# Altium footprint library Tomra_Cadstar_Footprints.PcbLib: 380 footprints (part 3 of 24)
Each footprint in its own frame and in the unit in brackets; x right, y up, seen from the top. Pads: shape width x height; smd on the part's side, far side on the other; paste and mask are expansions set on the pad; w line width, h text height; cw(c..) or ccw(c..) is an arc to the next point about the centre after c.
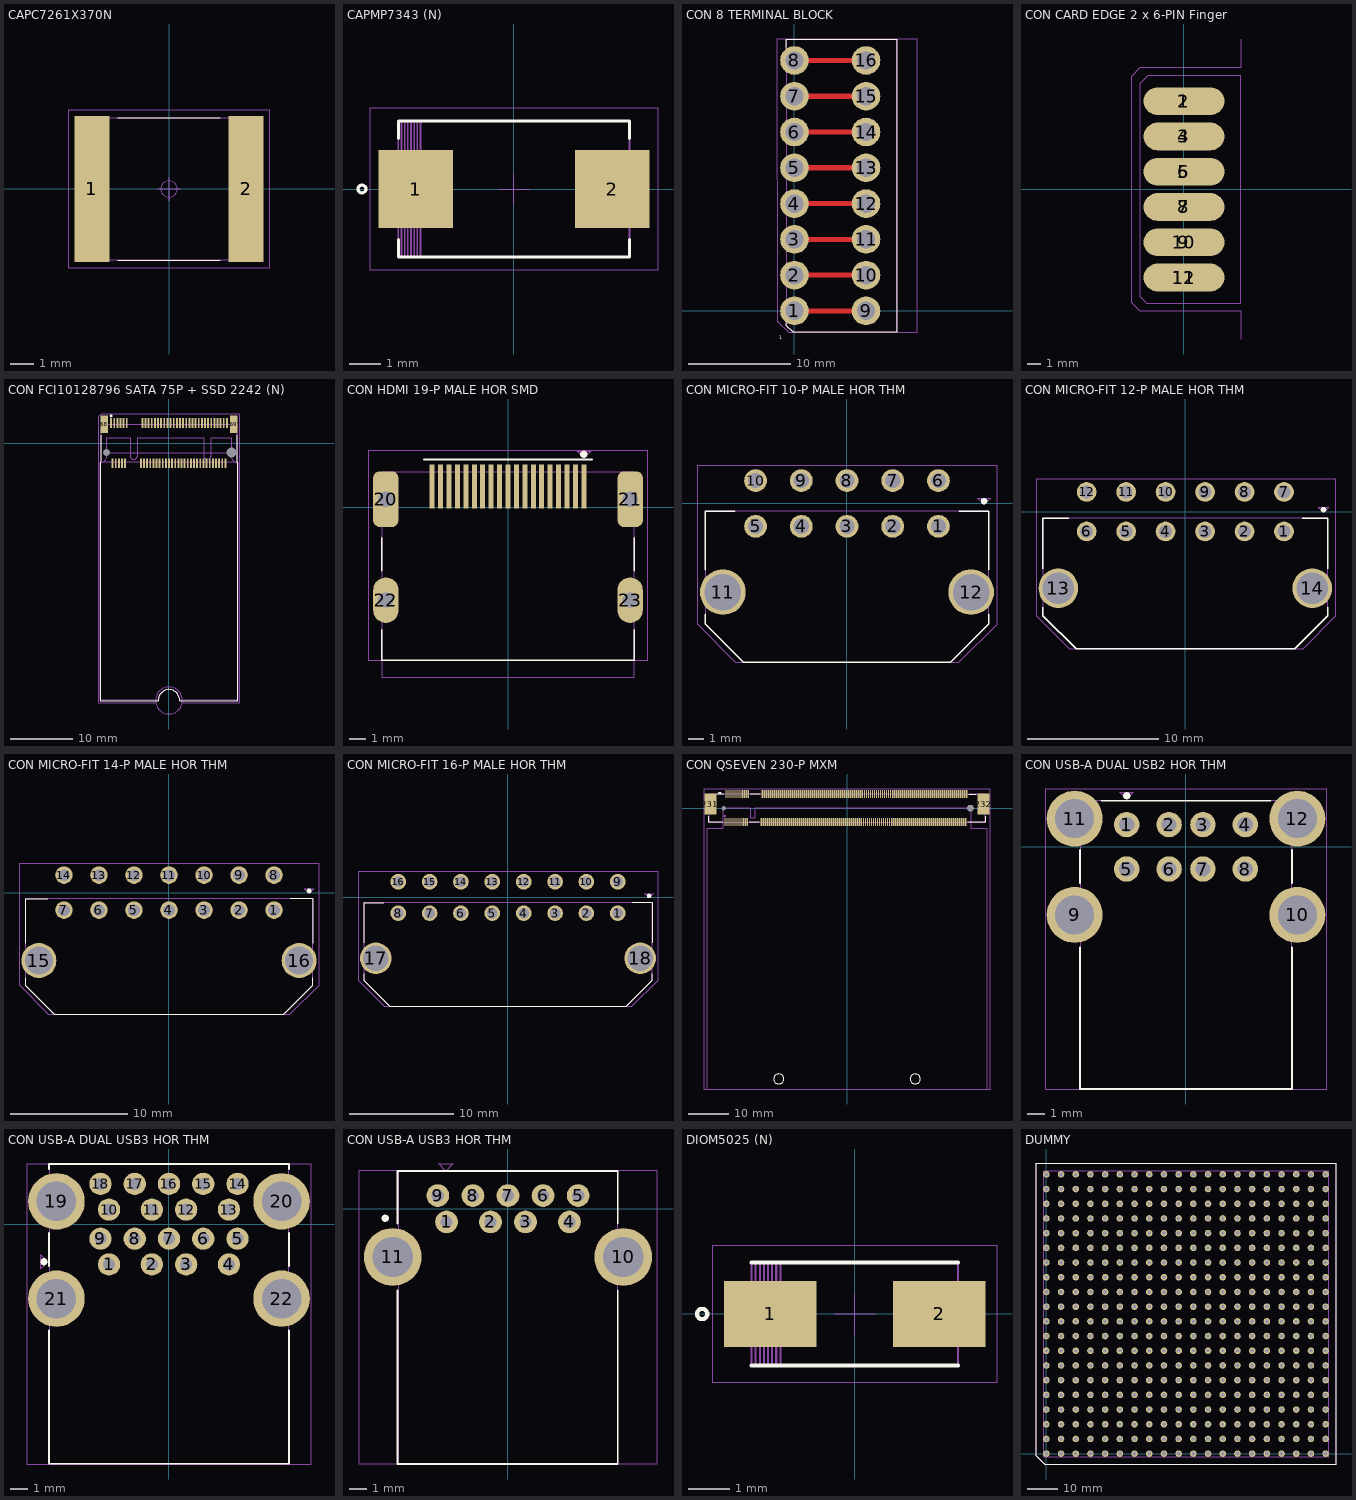
[diagram p2: the footprints below, top view; thin cyan lines are the x and y axes]

## CAPC7261X370N [mm]
pads (2):
  rect 1.5x6.25 smd paste+0 mask+0: 1(-3.3,0) 2(3.3,0)
Top Silk:
  lines w0.05: -2.2,-3.05 2.2,-3.05 ; -2.2,3.05 2.2,3.05
  text ".Designator" at 0,0 h0.7
Top Assembly:
  lines w0.05: -3.6,-3.05 -3.6,3.05 3.6,3.05 3.6,-3.05 -3.6,-3.05
Top Placement:
  lines w0.05: -0.5,0 0.5,0 ; 0,-0.5 0,0.5 ; -4.3,-3.4 -4.3,3.4 4.3,3.4 4.3,-3.4 -4.3,-3.4 ; -0.35,0 cw(c0,0) 0.35,0 cw(c0,0) -0.35,0

## CAPMP7343 (N) [mm]
height 4.3
pads (2):
  rect 2.35x2.45 smd paste+0 mask+0: 1(-3.1,0) 2(3.1,0)
Top Silk:
  lines w0.1: -3.65,-1.6 -3.65,-2.15 3.65,-2.15 3.65,-1.6 ; -3.65,1.6 -3.65,2.15 3.65,2.15 3.65,1.6 ; -4.925,0 cw(c-4.8,0) -4.675,0 cw(c-4.8,0) -4.925,0
  text ".Designator" at -3.65,2.15 h0.7
Top Assembly:
  lines w0.05: -3.55,-2.15 -3.55,2.15 ; -3.45,-2.15 -3.45,2.15 ; -3.35,-2.15 -3.35,2.15 ; -3.25,-2.15 -3.25,2.15 ; -3.15,-2.15 -3.15,2.15 ; -3.05,-2.15 -3.05,2.15 ; -2.95,-2.15 -2.95,2.15 ; -3.65,-2.15 3.65,-2.15 3.65,2.15 -3.65,2.15 ; -3.65,-2.15 -3.65,2.15 ; -3.65,-2.15 -3.65,2.15
Top Placement:
  lines w0.01: -0.5,0 0.5,0 ; 0,-0.5 0,0.5 ; -4.55,-2.55 4.55,-2.55 4.55,2.55 -4.55,2.55 -4.55,-2.55

## CON 8 TERMINAL BLOCK [mm]
pads (16):
  round 2.8 / inner round 1.524 / far side round 2.8 hole 1.8 paste+0 mask+0: 1(0,0) 2(0,3.5) 3(0,7) 4(0,10.5) 5(0,14) 6(0,17.5) 7(0,21) 8(0,24.5) 9(7,0) 10(7,3.5) 11(7,7) 12(7,10.5) 13(7,14) 14(7,17.5) 15(7,21) 16(7,24.5)
Top Elec:
  lines w0.5: 0.1,0 7,0 ; 0.1,3.5 7,3.5 ; 0.1,7 7,7 ; 0.1,10.5 7,10.5 ; 0.1,14 7,14 ; 0.1,17.5 7,17.5 ; 0.1,21 7,21 ; 0.1,24.5 7,24.5
Top Silk:
  lines w0.1: -0.8,-1.191 -0.8,-1.43 -0.1,-2.1 10,-2.1 10,26.6 -0.8,26.6 -0.8,25.691
  text "1" at -1.5,-2.75 h0.35
  text ".Designator" at 0,0 h0.7
Top Assembly:
  lines w0.05: -0.8,-1.398 -0.05,-2.1 10,-2.1 10,26.6 -0.8,26.6 -0.8,-1.398
Top Placement:
  lines w0.01: -1.725,26.6 12,26.6 12,-2.1 -0.575,-2.1 -1.7,-1 -1.725,26.6

## CON CARD EDGE 2 x 6-PIN Finger [mm]
pads (12):
  oval 5.82x2 / inner round 1.524 / far side oval 5.82x2 all layers, no hole paste+0 mask+0: 1(0,6.35) 2(0,6.35) 3(0,3.81) 4(0,3.81) 5(0,1.27) 6(0,1.27) 7(0,-1.27) 8(0,-1.27) 9(0,-3.81) 10(0,-3.81) 11(0,-6.35) 12(0,-6.35)
Top Silk:
  text ".Designator" at 0,0 h0.7
Top Assembly:
  lines w0.05: 4.09,-10.78 4.09,-8.763 -3.175,-8.763 -3.81,-8.128 -3.81,8.128 -3.175,8.763 4.09,8.763 4.09,10.83
Top Placement:
  lines w0.01: -3.2,-7.7 -3.2,7.6 -2.6,8.2 4.1,8.2 4.1,-8.2 -2.7,-8.2 -3.2,-7.7

## CON FCI10128796 SATA 75P + SSD 2242 (N) [mm]
height 8.7
pads (71):
  rect 0.3x1.55 smd paste+0 mask+0: 1(-9.25,3.269) 2(-9,-3.181) 3(-8.75,3.269) 4(-8.5,-3.181) 5(-8.25,3.269) 6(-8,-3.181) 7(-7.75,3.269) 8(-7.5,-3.181) 9(-7.25,3.269) 10(-7,-3.181) 11(-6.75,3.269) 12(-4.5,-3.181) 13(-4.25,3.269) 14(-4,-3.181) 15(-3.75,3.269) 16(-3.5,-3.181) 17(-3.25,3.269) 18(-3,-3.181) 19(-2.75,3.269) 20(-2.5,-3.181) 21(-2.25,3.269) 22(-2,-3.181) 23(-1.75,3.269) 24(-1.5,-3.181) 25(-1.25,3.269) 26(-1,-3.181) 27(-0.75,3.269) 28(-0.5,-3.181) 29(-0.25,3.269) 30(0,-3.181) 31(0.25,3.269) 32(0.5,-3.181) 33(0.75,3.269) 34(1,-3.181) 35(1.25,3.269) 36(1.5,-3.181) 37(1.75,3.269) 38(2,-3.181) 39(2.25,3.269) 40(2.5,-3.181) 41(2.75,3.269) 42(3,-3.181) 43(3.25,3.269) 44(3.5,-3.181) 45(3.75,3.269) 46(4,-3.181) 47(4.25,3.269) 48(4.5,-3.181) 49(4.75,3.269) 50(5,-3.181) 51(5.25,3.269) 52(5.5,-3.181) 53(5.75,3.269) 54(6,-3.181) 55(6.25,3.269) 56(6.5,-3.181) 57(6.75,3.269) 58(7,-3.181) 59(7.25,3.269) 60(7.5,-3.181) 61(7.75,3.269) 62(8,-3.181) 63(8.25,3.269) 64(8.5,-3.181) 65(8.75,3.269) 66(9,-3.181) 67(9.25,3.269)
  rect 1.2x2.75 smd paste+0 mask+0: 68(-10.35,3.049) 69(10.35,3.049)
  round 0 / inner round 1.524 / far side round 0 hole 1.6 unplated paste+0 mask+0: 70(10,-1.466)
  round 0 / inner round 1.524 / far side round 0 hole 1.1 unplated paste+0 mask+0: 71(-10,-1.466)
Top Silk:
  region: -9.25,4.194 -9.29,4.194 -9.363,4.225 -9.42,4.281 -9.45,4.354 -9.45,4.434 -9.42,4.507 -9.363,4.564 -9.29,4.594 -9.25,4.594 -9.21,4.594 -9.137,4.564 -9.08,4.507 -9.05,4.434 -9.05,4.354 -9.08,4.281 -9.137,4.225 -9.21,4.194
  lines w0.1: -10.9,1.294 -10.9,-2.806 -11,-2.906 -11,-41.106 -1.7,-41.106 cw(c0,-41.006) -0.1,-39.306 0,-39.306 cw(c-0.05,-41.056) 1.7,-41.106 11,-41.106 11,-3.106 10.9,-3.006 10.9,1.394
Top Assembly:
  lines w0.05: -9.925,-1.466 9.925,-1.466 ; -11,-41.066 -1.75,-41.066 cw(c0,-41.066) 0,-39.316 cw(c0,-41.066) 1.75,-41.066 11,-41.066 11,-3.066 cw(c11,-1.991) 9.925,-1.991 9.925,0.934 6.725,0.934 6.725,-1.966 cw(c6.125,-1.966) 6.125,-2.566 cw(c6.125,-1.966) 5.525,-1.966 5.525,0.934 -5.025,0.934 -5.025,-1.966 cw(c-5.625,-1.966) -5.625,-2.566 cw(c-5.625,-1.966) -6.225,-1.966 -6.225,0.934 -9.925,0.934 -9.925,-1.991 cw(c-11,-1.991) -11,-3.066 -11,-41.066 ; -10.925,-2.906 10.925,-2.906 10.925,2.994 -10.2,2.994 -10.925,2.269 -10.925,-2.906
  text ".Designator" at -3.699,4.919 h0.7
Top Placement:
  lines w0.01: -11.3,-41.406 -2.102,-41.406 ccw(c0.002,-41.097) 2.106,-41.406 11.3,-41.406 11.3,4.694 -10.853,4.694 -11.3,4.247 -11.3,-41.406 ; 0,-43.216 cw(c0,-41.066) 0,-38.916 cw(c0,-41.066) 0,-43.216

## CON HDMI 19-P MALE HOR SMD [mm]
height 6.3
pads (23):
  rect 0.3x2.6 smd paste+0 mask+0: 1(4.5,1.25) 2(4,1.25) 3(3.5,1.25) 4(3,1.25) 5(2.5,1.25) 6(2,1.25) 7(1.5,1.25) 8(1,1.25) 9(0.5,1.25) 10(0,1.25) 11(-0.5,1.25) 12(-1,1.25) 13(-1.5,1.25) 14(-2,1.25) 15(-2.5,1.25) 16(-3,1.25) 17(-3.5,1.25) 18(-4,1.25) 19(-4.5,1.25)
  rrect50% 1.5x3.3 / inner round 1.524 / far side rrect50% 1.5x3.3 hole 0.9 paste+0 mask+0: 20(-7.25,0.49) 21(7.25,0.49)
  oval 1.5x2.7 / inner round 1.524 / far side oval 1.5x2.7 hole 0.9 mask+0: 22(-7.25,-5.5) 23(7.25,-5.5)
Top Silk:
  region: 4.5,2.95 4.46,2.95 4.387,2.98 4.33,3.037 4.3,3.11 4.3,3.19 4.33,3.263 4.387,3.32 4.46,3.35 4.5,3.35 4.54,3.35 4.613,3.32 4.67,3.263 4.7,3.19 4.7,3.11 4.67,3.037 4.613,2.98 4.54,2.95
  lines w0.1: -7.5,-7.26 -7.5,-9.06 7.5,-9.06 7.5,-7.26 ; -7.5,-3.75 -7.5,-1.8 ; -5,2.85 5,2.85 ; 7.5,-3.75 7.5,-1.8
  text ".Designator" at -0.26,3.86 h0.7
Top Assembly:
  lines w0.05: -7.5,-10.06 7.5,-10.06 7.5,2.09 -7.5,2.09 -7.5,-10.06 ; 4.1,3.34 4.5,2.94 4.9,3.34 4.1,3.34
Top Placement:
  lines w0.01: -8.3,-9.06 8.3,-9.06 8.3,3.35 -8.3,3.35 -8.3,-9.06

## CON MICRO-FIT 10-P MALE HOR THM [mm]
height 8.77
pads (12):
  round 1.5 / inner round 1.524 / far side round 1.5 hole 1 paste+0 mask+0: 1(6,-1.5) 2(3,-1.5) 3(0,-1.5) 4(-3,-1.5) 5(-6,-1.5) 6(6,1.5) 7(3,1.5) 8(0,1.5) 9(-3,1.5) 10(-6,1.5)
  round 3 / inner round 1.524 / far side round 3 hole 2.4 paste+0 mask+0: 11(-8.15,-5.82) 12(8.15,-5.82)
Top Silk:
  region: 9,-0.05 8.96,-0.05 8.887,-0.02 8.83,0.037 8.8,0.11 8.8,0.19 8.83,0.263 8.887,0.32 8.96,0.35 9,0.35 9.04,0.35 9.113,0.32 9.17,0.263 9.2,0.19 9.2,0.11 9.17,0.037 9.113,-0.02 9.04,-0.05
  lines w0.1: -9.32,-7.28 -9.32,-7.9 -6.8,-10.42 6.8,-10.42 9.32,-7.9 9.32,-7.28 ; -9.32,-4.35 -9.32,-0.51 -7.37,-0.51 ; 7.37,-0.51 9.32,-0.51 9.32,-4.35
  text ".Designator" at -7.5,3 h0.7
Top Assembly:
  lines w0.05: -9.32,-7.9 -6.8,-10.42 6.8,-10.42 9.32,-7.9 9.32,-0.51 -9.32,-0.51 -9.32,-7.9 ; 8.6,0.35 9,-0.05 9.4,0.35 8.6,0.35
Top Placement:
  lines w0.01: -9.85,-7.9 -7.33,-10.42 7.35,-10.42 9.85,-7.92 9.85,2.47 -9.85,2.47 -9.85,-7.9

## CON MICRO-FIT 12-P MALE HOR THM [mm]
height 8.77
pads (14):
  round 1.5 / inner round 1.524 / far side round 1.5 hole 1 paste+0 mask+0: 1(7.5,-1.5) 2(4.5,-1.5) 3(1.5,-1.5) 4(-1.5,-1.5) 5(-4.5,-1.5) 6(-7.5,-1.5) 7(7.5,1.5) 8(4.5,1.5) 9(1.5,1.5) 10(-1.5,1.5) 11(-4.5,1.5) 12(-7.5,1.5)
  round 3 / inner round 1.524 / far side round 3 hole 2.4 paste+0 mask+0: 13(-9.65,-5.82) 14(9.65,-5.82)
Top Silk:
  region: 10.5,-0.05 10.46,-0.05 10.387,-0.02 10.33,0.037 10.3,0.11 10.3,0.19 10.33,0.263 10.387,0.32 10.46,0.35 10.5,0.35 10.54,0.35 10.613,0.32 10.67,0.263 10.7,0.19 10.7,0.11 10.67,0.037 10.613,-0.02 10.54,-0.05
  lines w0.1: -10.82,-7.28 -10.82,-7.9 -8.3,-10.42 8.3,-10.42 10.82,-7.9 10.82,-7.28 ; -10.82,-4.35 -10.82,-0.51 -8.87,-0.51 ; 8.87,-0.51 10.82,-0.51 10.82,-4.35
  text ".Designator" at -7.5,3 h0.7
Top Assembly:
  lines w0.05: -10.82,-7.9 -8.3,-10.42 8.3,-10.42 10.82,-7.9 10.82,-0.51 -10.82,-0.51 -10.82,-7.9 ; 10.1,0.35 10.5,-0.05 10.9,0.35 10.1,0.35
Top Placement:
  lines w0.01: -11.35,-7.9 -8.83,-10.42 8.95,-10.42 11.45,-7.92 11.45,2.47 -11.35,2.47 -11.35,-7.9

## CON MICRO-FIT 14-P MALE HOR THM [mm]
height 8.77
pads (16):
  round 1.5 / inner round 1.524 / far side round 1.5 hole 1 paste+0 mask+0: 1(9,-1.5) 2(6,-1.5) 3(3,-1.5) 4(0,-1.5) 5(-3,-1.5) 6(-6,-1.5) 7(-9,-1.5) 8(9,1.5) 9(6,1.5) 10(3,1.5) 11(0,1.5) 12(-3,1.5) 13(-6,1.5) 14(-9,1.5)
  round 3 / inner round 1.524 / far side round 3 hole 2.4 paste+0 mask+0: 15(-11.15,-5.82) 16(11.15,-5.82)
Top Silk:
  region: 12,-0.05 11.96,-0.05 11.887,-0.02 11.83,0.037 11.8,0.11 11.8,0.19 11.83,0.263 11.887,0.32 11.96,0.35 12,0.35 12.04,0.35 12.113,0.32 12.17,0.263 12.2,0.19 12.2,0.11 12.17,0.037 12.113,-0.02 12.04,-0.05
  lines w0.1: -12.32,-7.28 -12.32,-7.925 -9.825,-10.42 9.825,-10.42 12.32,-7.925 12.32,-7.28 ; -12.32,-4.35 -12.32,-0.51 -10.37,-0.51 ; 10.37,-0.51 12.32,-0.51 12.32,-4.35
  text ".Designator" at -7.5,3 h0.7
Top Assembly:
  lines w0.05: -12.32,-7.925 -9.825,-10.42 9.825,-10.42 12.32,-7.925 12.32,-0.51 -12.32,-0.51 -12.32,-7.925 ; 11.6,0.35 12,-0.05 12.4,0.35 11.6,0.35
Top Placement:
  lines w0.01: -12.85,-7.9 -10.33,-10.42 10.35,-10.42 12.85,-7.92 12.85,2.47 -12.85,2.47 -12.85,-7.9

## CON MICRO-FIT 16-P MALE HOR THM [mm]
height 8.77
pads (18):
  round 1.5 / inner round 1.524 / far side round 1.5 hole 1 paste+0 mask+0: 1(10.5,-1.5) 2(7.5,-1.5) 3(4.5,-1.5) 4(1.5,-1.5) 5(-1.5,-1.5) 6(-4.5,-1.5) 7(-7.5,-1.5) 8(-10.5,-1.5) 9(10.5,1.5) 10(7.5,1.5) 11(4.5,1.5) 12(1.5,1.5) 13(-1.5,1.5) 14(-4.5,1.5) 15(-7.5,1.5) 16(-10.5,1.5)
  round 3 / inner round 1.524 / far side round 3 hole 2.4 paste+0 mask+0: 17(-12.65,-5.82) 18(12.65,-5.82)
Top Silk:
  region: 13.5,-0.05 13.46,-0.05 13.387,-0.02 13.33,0.037 13.3,0.11 13.3,0.19 13.33,0.263 13.387,0.32 13.46,0.35 13.5,0.35 13.54,0.35 13.613,0.32 13.67,0.263 13.7,0.19 13.7,0.11 13.67,0.037 13.613,-0.02 13.54,-0.05
  lines w0.1: -13.82,-7.28 -13.82,-7.9 -11.3,-10.42 11.3,-10.42 13.82,-7.9 13.82,-7.28 ; -13.82,-4.35 -13.82,-0.51 -11.87,-0.51 ; 11.87,-0.51 13.82,-0.51 13.82,-4.35
  text ".Designator" at -6,3 h0.7
Top Assembly:
  lines w0.05: -13.82,-7.9 -11.3,-10.42 11.3,-10.42 13.82,-7.9 13.82,-0.51 -13.82,-0.51 -13.82,-7.9 ; 13.1,0.35 13.5,-0.05 13.9,0.35 13.1,0.35
Top Placement:
  lines w0.01: -14.35,-7.9 -11.83,-10.42 11.85,-10.42 14.35,-7.92 14.35,2.47 -14.35,2.47 -14.35,-7.9

## CON QSEVEN 230-P MXM [mm]
height 7.8
pads (234):
  rect 0.35x2 smd paste+0 mask+0: 1(-30.4,-3.5) 2(-30.15,3.5) 3(-29.9,-3.5) 4(-29.65,3.5) 5(-29.4,-3.5) 6(-29.15,3.5) 7(-28.9,-3.5) 8(-28.65,3.5) 9(-28.4,-3.5) 10(-28.15,3.5) 11(-27.9,-3.5) 12(-27.65,3.5) 13(-27.4,-3.5) 14(-27.15,3.5) 15(-26.9,-3.5) 16(-26.65,3.5) 17(-26.4,-3.5) 18(-26.15,3.5) 19(-25.9,-3.5) 20(-25.65,3.5) 21(-25.4,-3.5) 22(-25.15,3.5) 23(-24.9,-3.5) 24(-24.65,3.5) 25(-21.4,-3.5) 26(-21.15,3.5) 27(-20.9,-3.5) 28(-20.65,3.5) 29(-20.4,-3.5) 30(-20.15,3.5) 31(-19.9,-3.5) 32(-19.65,3.5) 33(-19.4,-3.5) 34(-19.15,3.5) 35(-18.9,-3.5) 36(-18.65,3.5) 37(-18.4,-3.5) 38(-18.15,3.5) 39(-17.9,-3.5) 40(-17.65,3.5) 41(-17.4,-3.5) 42(-17.15,3.5) 43(-16.9,-3.5) 44(-16.65,3.5) 45(-16.4,-3.5) 46(-16.15,3.5) 47(-15.9,-3.5) 48(-15.65,3.5) 49(-15.4,-3.5) 50(-15.15,3.5) 51(-14.9,-3.5) 52(-14.65,3.5) 53(-14.4,-3.5) 54(-14.15,3.5) 55(-13.9,-3.5) 56(-13.65,3.5) 57(-13.4,-3.5) 58(-13.15,3.5) 59(-12.9,-3.5) 60(-12.65,3.5) 61(-12.4,-3.5) 62(-12.15,3.5) 63(-11.9,-3.5) 64(-11.65,3.5) 65(-11.4,-3.5) 66(-11.15,3.5) 67(-10.9,-3.5) 68(-10.65,3.5) 69(-10.4,-3.5) 70(-10.15,3.5) 71(-9.9,-3.5) 72(-9.65,3.5) 73(-9.4,-3.5) 74(-9.15,3.5) 75(-8.9,-3.5) 76(-8.65,3.5) 77(-8.4,-3.5) 78(-8.15,3.5) 79(-7.9,-3.5) 80(-7.65,3.5) 81(-7.4,-3.5) 82(-7.15,3.5) 83(-6.9,-3.5) 84(-6.65,3.5) 85(-6.4,-3.5) 86(-6.15,3.5) 87(-5.9,-3.5) 88(-5.65,3.5) 89(-5.4,-3.5) 90(-5.15,3.5) 91(-4.9,-3.5) 92(-4.65,3.5) 93(-4.4,-3.5) 94(-4.15,3.5) 95(-3.9,-3.5) 96(-3.65,3.5) 97(-3.4,-3.5) 98(-3.15,3.5) 99(-2.9,-3.5) 100(-2.65,3.5) 101(-2.4,-3.5) 102(-2.15,3.5) 103(-1.9,-3.5) 104(-1.65,3.5) 105(-1.4,-3.5) 106(-1.15,3.5) 107(-0.9,-3.5) 108(-0.65,3.5) 109(-0.4,-3.5) 110(-0.15,3.5) 111(0.1,-3.5) 112(0.35,3.5) 113(0.6,-3.5) 114(0.85,3.5) 115(1.1,-3.5) 116(1.35,3.5) 117(1.6,-3.5) 118(1.85,3.5) 119(2.1,-3.5) 120(2.35,3.5) 121(2.6,-3.5) 122(2.85,3.5) 123(3.1,-3.5) 124(3.35,3.5) 125(3.6,-3.5) 126(3.85,3.5) 127(4.1,-3.5) 128(4.35,3.5) 129(4.6,-3.5) 130(4.85,3.5) 131(5.1,-3.5) 132(5.35,3.5) 133(5.6,-3.5) 134(5.85,3.5) 135(6.1,-3.5) 136(6.35,3.5) 137(6.6,-3.5) 138(6.85,3.5) 139(7.1,-3.5) 140(7.35,3.5) 141(7.6,-3.5) 142(7.85,3.5) 143(8.1,-3.5) 144(8.35,3.5) 145(8.6,-3.5) 146(8.85,3.5) 147(9.1,-3.5) 148(9.35,3.5) 149(9.6,-3.5) 150(9.85,3.5) 151(10.1,-3.5) 152(10.35,3.5) 153(10.6,-3.5) 154(10.85,3.5) 155(11.1,-3.5) 156(11.35,3.5) 157(11.6,-3.5) 158(11.85,3.5) 159(12.1,-3.5) 160(12.35,3.5) 161(12.6,-3.5) 162(12.85,3.5) 163(13.1,-3.5) 164(13.35,3.5) 165(13.6,-3.5) 166(13.85,3.5) 167(14.1,-3.5) 168(14.35,3.5) 169(14.6,-3.5) 170(14.85,3.5) 171(15.1,-3.5) 172(15.35,3.5) 173(15.6,-3.5) 174(15.85,3.5) 175(16.1,-3.5) 176(16.35,3.5) 177(16.6,-3.5) 178(16.85,3.5) 179(17.1,-3.5) 180(17.35,3.5) 181(17.6,-3.5) 182(17.85,3.5) 183(18.1,-3.5) 184(18.35,3.5) 185(18.6,-3.5) 186(18.85,3.5) 187(19.1,-3.5) 188(19.35,3.5) 189(19.6,-3.5) 190(19.85,3.5) 191(20.1,-3.5) 192(20.35,3.5) 193(20.6,-3.5) 194(20.85,3.5) 195(21.1,-3.5) 196(21.35,3.5) 197(21.6,-3.5) 198(21.85,3.5) 199(22.1,-3.5) 200(22.35,3.5) 201(22.6,-3.5) 202(22.85,3.5) 203(23.1,-3.5) 204(23.35,3.5) 205(23.6,-3.5) 206(23.85,3.5) 207(24.1,-3.5) 208(24.35,3.5) 209(24.6,-3.5) 210(24.85,3.5) 211(25.1,-3.5) 212(25.35,3.5) 213(25.6,-3.5) 214(25.85,3.5) 215(26.1,-3.5) 216(26.35,3.5) 217(26.6,-3.5) 218(26.85,3.5) 219(27.1,-3.5) 220(27.35,3.5) 221(27.6,-3.5) 222(27.85,3.5) 223(28.1,-3.5) 224(28.35,3.5) 225(28.6,-3.5) 226(28.85,3.5) 227(29.1,-3.5) 228(29.35,3.5) 229(29.6,-3.5) 230(29.85,3.5)
  rect 3x5.2 smd paste+0 mask+0: 231(-34.06,1) 232(34.06,1)
  round 0 / inner round 1.524 / far side round 0 hole 1.1 unplated paste+0 mask+0: 233(-30.75,0)
  round 1.6 / inner round 1.524 / far side round 1.6 hole 1.6 unplated paste+0 mask+0: 234(30.75,0)
Top Silk:
  lines w0.1: -34.4,-2 -34.4,-3.5 -30.9,-3.5 ; -32.3,3.5 -30.65,3.5 ; -24.4,-3.5 -21.9,-3.5 ; -24.15,3.5 -21.65,3.5 ; 30.1,-3.5 34.5,-3.5 34.5,-2 ; 30.35,3.5 32.2,3.5 ; -31.9,4 -31.65,3.5 -31.4,4 -31.9,4 ; -17,-68.75 cw(c-17,-67.5) -17,-66.25 cw(c-17,-67.5) -17,-68.75 ; 17,-68.75 cw(c17,-67.5) 17,-66.25 cw(c17,-67.5) 17,-68.75
  text ".Designator" at -4.999,5.9 h0.7
Top Assembly:
  region: -30.4,-2.25 -30.45,-2.25 -30.542,-2.212 -30.612,-2.142 -30.65,-2.05 -30.65,-1.95 -30.612,-1.858 -30.542,-1.788 -30.45,-1.75 -30.4,-1.75 -30.35,-1.75 -30.258,-1.788 -30.188,-1.858 -30.15,-1.95 -30.15,-2.05 -30.188,-2.142 -30.258,-2.212 -30.35,-2.25
  lines w0.05: -35,-70 35,-70 35,-5.1 31,-5.1 31,0 -22.975,0 -22.975,-2.5 -23.975,-2.5 -23.975,0 -31,0 -31,-5.1 -35,-5.1 -35,-70 ; -34.4,-3.5 34.5,-3.5 34.5,3.5 -34.4,3.5 -34.4,-3.5
Top Placement:
  lines w0.01: -35.65,-70 35.7,-70 35.7,4.75 -35.65,4.75 -35.65,-70

## CON USB-A DUAL USB2 HOR THM [mm]
height 16
pads (12):
  round 1.5 / inner round 1.524 / far side round 1.5 hole 0.9 paste+0 mask+0: 1(-3.49,1.32) 2(-0.99,1.32) 3(1.01,1.32) 4(3.51,1.32) 5(-3.49,-1.3) 6(-0.99,-1.3) 7(1.01,-1.3) 8(3.51,-1.3)
  round 3.3 / inner round 1.524 / far side round 3.3 hole 2.3 paste+0 mask+0: 9(-6.56,-4.01) 10(6.58,-4.01) 11(-6.56,1.67) 12(6.58,1.67)
Top Silk:
  region: -3.49,2.82 -3.53,2.82 -3.603,2.85 -3.66,2.907 -3.69,2.98 -3.69,3.06 -3.66,3.133 -3.603,3.19 -3.53,3.22 -3.49,3.22 -3.45,3.22 -3.377,3.19 -3.32,3.133 -3.29,3.06 -3.29,2.98 -3.32,2.907 -3.377,2.85 -3.45,2.82
  lines w0.1: -6.24,-5.93 -6.24,-14.28 6.26,-14.28 6.26,-5.93 ; -6.24,-2.13 -6.24,-0.18 ; -4.99,2.72 5.01,2.72 ; 6.26,-2.13 6.26,-0.18
  text ".Designator" at 0,3.93 h0.7
Top Assembly:
  lines w0.05: -6.24,-14.28 6.26,-14.28 6.26,2.72 -6.24,2.72 -6.24,-14.28 ; -3.89,3.22 -3.49,2.82 -3.09,3.22 -3.89,3.22
Top Placement:
  lines w0.01: -8.29,-14.28 8.31,-14.28 8.31,3.42 -8.29,3.42 -8.29,-14.28

## CON USB-A DUAL USB3 HOR THM [mm]
height 16
pads (22):
  round 1.3 / inner round 1.524 / far side round 1.3 hole 0.7 paste+0 mask+0: 1(-3.5,-2.35) 2(-1,-2.35) 3(1,-2.35) 4(3.5,-2.35) 5(4,-0.85) 6(2,-0.85) 7(0,-0.85) 8(-2,-0.85) 9(-4,-0.85) 10(-3.5,0.85) 11(-1,0.85) 12(1,0.85) 13(3.5,0.85) 14(4,2.35) 15(2,2.35) 16(0,2.35) 17(-2,2.35) 18(-4,2.35)
  round 3.3 / inner round 1.524 / far side round 3.3 hole 2.3 paste+0 mask+0: 19(-6.57,1.33) 20(6.57,1.33) 21(-6.57,-4.35) 22(6.57,-4.35)
Top Silk:
  region: -7.3,-2.4 -7.34,-2.4 -7.413,-2.37 -7.47,-2.313 -7.5,-2.24 -7.5,-2.16 -7.47,-2.087 -7.413,-2.03 -7.34,-2 -7.3,-2 -7.26,-2 -7.187,-2.03 -7.13,-2.087 -7.1,-2.16 -7.1,-2.24 -7.13,-2.313 -7.187,-2.37 -7.26,-2.4
  lines w0.1: -7,-6.2 -7,-13.99 7,-13.99 7,-6.2 ; -7,-2.45 -7,-0.5 ; -7,3.2 -7,3.51 7,3.51 7,3.2 ; 7,-2.45 7,-0.5
  text ".Designator" at 0,4.1 h0.7
Top Assembly:
  lines w0.05: -7.5,-2.6 -7.1,-2.2 -7.5,-1.8 -7.5,-2.6 ; -7,-13.99 7,-13.99 7,3.51 -7,3.51 -7,-13.99
Top Placement:
  lines w0.01: -8.3,-14 8.3,-14 8.3,3.51 -8.3,3.51 -8.3,-14

## CON USB-A USB3 HOR THM [mm]
height 8
pads (11):
  round 1.3 / inner round 1.524 / far side round 1.3 hole 0.7 paste+0 mask+0: 1(-3.5,-0.75) 2(-1,-0.75) 3(1,-0.75) 4(3.5,-0.75) 5(4,0.75) 6(2,0.75) 7(0,0.75) 8(-2,0.75) 9(-4,0.75)
  round 3.3 / inner round 1.524 / far side round 3.3 hole 2.3 paste+0 mask+0: 10(6.57,-2.75) 11(-6.57,-2.75)
Top Silk:
  region: -7,-0.75 -7.04,-0.75 -7.113,-0.72 -7.17,-0.663 -7.2,-0.59 -7.2,-0.51 -7.17,-0.437 -7.113,-0.38 -7.04,-0.35 -7,-0.35 -6.96,-0.35 -6.887,-0.38 -6.83,-0.437 -6.8,-0.51 -6.8,-0.59 -6.83,-0.663 -6.887,-0.72 -6.96,-0.75
  lines w0.1: -6.3,-4.65 -6.3,-14.55 6.25,-14.55 6.25,-4.65 ; -6.3,-0.85 -6.3,2.15 6.26,2.15 6.26,-0.85
  text ".Designator" at 0.05,2.55 h0.7
Top Assembly:
  lines w0.05: -6.25,-14.55 6.25,-14.55 6.25,2.15 -6.25,2.15 -6.25,-14.55 ; -3.95,2.55 -3.55,2.15 -3.15,2.55 -3.95,2.55
Top Placement:
  lines w0.01: -8.5,-14.54 8.5,-14.54 8.5,2.16 -8.5,2.16 -8.5,-14.54

## DIOM5025 (N) [mm]
height 2.31
pads (2):
  rect 2.25x1.6 smd paste+0 mask+0: 1(-2.05,0) 2(2.05,0)
Top Silk:
  lines w0.1: -2.5,-1.25 2.5,-1.25 ; -2.5,1.25 2.5,1.25 ; -3.825,0 cw(c-3.7,0) -3.575,0 cw(c-3.7,0) -3.825,0
  text ".Designator" at -3.599,-0.35 h0.7
Top Assembly:
  lines w0.05: -2.402,-1.242 -2.402,1.242 ; -2.302,-1.242 -2.302,1.242 ; -2.203,-1.242 -2.203,1.242 ; -2.103,-1.242 -2.103,1.242 ; -2.003,-1.242 -2.003,1.242 ; -1.903,-1.242 -1.903,1.242 ; -1.803,-1.242 -1.803,1.242 ; -2.502,-1.242 2.502,-1.242 2.502,1.242 -2.502,1.242 ; -2.502,-1.242 -2.502,1.242 ; -2.502,-1.242 -2.502,1.242
Top Placement:
  lines w0.01: -0.5,0 0.5,0 ; 0,-0.5 0,0.5 ; -3.45,-1.65 3.45,-1.65 3.45,1.65 -3.45,1.65 -3.45,-1.65

## DUMMY [mm]
height 100
pads (400):
  round 2.2 / inner round 1.524 / far side round 2.2 hole 1.3 paste+0 mask+0: 1(0,0) 2(0,4.9) 3(0,9.8) 4(0,14.7) 5(0,19.6) 6(0,24.5) 7(0,29.4) 8(0,34.3) 9(0,39.2) 10(0,44.1) 11(0,49) 12(0,53.9) 13(0,58.8) 14(0,63.7) 15(0,68.6) 16(0,73.5) 17(0,78.4) 18(0,83.3) 19(0,88.2) 20(0,93.1) 21(4.9,0) 22(4.9,4.9) 23(4.9,9.8) 24(4.9,14.7) 25(4.9,19.6) 26(4.9,24.5) 27(4.9,29.4) 28(4.9,34.3) 29(4.9,39.2) 30(4.9,44.1) 31(4.9,49) 32(4.9,53.9) 33(4.9,58.8) 34(4.9,63.7) 35(4.9,68.6) 36(4.9,73.5) 37(4.9,78.4) 38(4.9,83.3) 39(4.9,88.2) 40(4.9,93.1) 41(9.8,0) 42(9.8,4.9) 43(9.8,9.8) 44(9.8,14.7) 45(9.8,19.6) 46(9.8,24.5) 47(9.8,29.4) 48(9.8,34.3) 49(9.8,39.2) 50(9.8,44.1) 51(9.8,49) 52(9.8,53.9) 53(9.8,58.8) 54(9.8,63.7) 55(9.8,68.6) 56(9.8,73.5) 57(9.8,78.4) 58(9.8,83.3) 59(9.8,88.2) 60(9.8,93.1) 61(14.7,0) 62(14.7,4.9) 63(14.7,9.8) 64(14.7,14.7) 65(14.7,19.6) 66(14.7,24.5) 67(14.7,29.4) 68(14.7,34.3) 69(14.7,39.2) 70(14.7,44.1) 71(14.7,49) 72(14.7,53.9) 73(14.7,58.8) 74(14.7,63.7) 75(14.7,68.6) 76(14.7,73.5) 77(14.7,78.4) 78(14.7,83.3) 79(14.7,88.2) 80(14.7,93.1) 81(19.6,0) 82(19.6,4.9) 83(19.6,9.8) 84(19.6,14.7) 85(19.6,19.6) 86(19.6,24.5) 87(19.6,29.4) 88(19.6,34.3) 89(19.6,39.2) 90(19.6,44.1) 91(19.6,49) 92(19.6,53.9) 93(19.6,58.8) 94(19.6,63.7) 95(19.6,68.6) 96(19.6,73.5) 97(19.6,78.4) 98(19.6,83.3) 99(19.6,88.2) 100(19.6,93.1) 101(24.5,0) 102(24.5,4.9) 103(24.5,9.8) 104(24.5,14.7) 105(24.5,19.6) 106(24.5,24.5) 107(24.5,29.4) 108(24.5,34.3) 109(24.5,39.2) 110(24.5,44.1) 111(24.5,49) 112(24.5,53.9) 113(24.5,58.8) 114(24.5,63.7) 115(24.5,68.6) 116(24.5,73.5) 117(24.5,78.4) 118(24.5,83.3) 119(24.5,88.2) 120(24.5,93.1) 121(29.4,0) 122(29.4,4.9) 123(29.4,9.8) 124(29.4,14.7) 125(29.4,19.6) 126(29.4,24.5) 127(29.4,29.4) 128(29.4,34.3) 129(29.4,39.2) 130(29.4,44.1) 131(29.4,49) 132(29.4,53.9) 133(29.4,58.8) 134(29.4,63.7) 135(29.4,68.6) 136(29.4,73.5) 137(29.4,78.4) 138(29.4,83.3) 139(29.4,88.2) 140(29.4,93.1) 141(34.3,0) 142(34.3,4.9) 143(34.3,9.8) 144(34.3,14.7) 145(34.3,19.6) 146(34.3,24.5) 147(34.3,29.4) 148(34.3,34.3) 149(34.3,39.2) 150(34.3,44.1) 151(34.3,49) 152(34.3,53.9) 153(34.3,58.8) 154(34.3,63.7) 155(34.3,68.6) 156(34.3,73.5) 157(34.3,78.4) 158(34.3,83.3) 159(34.3,88.2) 160(34.3,93.1) 161(39.2,0) 162(39.2,4.9) 163(39.2,9.8) 164(39.2,14.7) 165(39.2,19.6) 166(39.2,24.5) 167(39.2,29.4) 168(39.2,34.3) 169(39.2,39.2) 170(39.2,44.1) 171(39.2,49) 172(39.2,53.9) 173(39.2,58.8) 174(39.2,63.7) 175(39.2,68.6) 176(39.2,73.5) 177(39.2,78.4) 178(39.2,83.3) 179(39.2,88.2) 180(39.2,93.1) 181(44.1,0) 182(44.1,4.9) 183(44.1,9.8) 184(44.1,14.7) 185(44.1,19.6) 186(44.1,24.5) 187(44.1,29.4) 188(44.1,34.3) 189(44.1,39.2) 190(44.1,44.1) 191(44.1,49) 192(44.1,53.9) 193(44.1,58.8) 194(44.1,63.7) 195(44.1,68.6) 196(44.1,73.5) 197(44.1,78.4) 198(44.1,83.3) 199(44.1,88.2) 200(44.1,93.1) 201(49,0) 202(49,4.9) 203(49,9.8) 204(49,14.7) 205(49,19.6) 206(49,24.5) 207(49,29.4) 208(49,34.3) 209(49,39.2) 210(49,44.1) 211(49,49) 212(49,53.9) 213(49,58.8) 214(49,63.7) 215(49,68.6) 216(49,73.5) 217(49,78.4) 218(49,83.3) 219(49,88.2) 220(49,93.1) 221(53.9,0) 222(53.9,4.9) 223(53.9,9.8) 224(53.9,14.7) 225(53.9,19.6) 226(53.9,24.5) 227(53.9,29.4) 228(53.9,34.3) 229(53.9,39.2) 230(53.9,44.1) 231(53.9,49) 232(53.9,53.9) 233(53.9,58.8) 234(53.9,63.7) 235(53.9,68.6) 236(53.9,73.5) 237(53.9,78.4) 238(53.9,83.3) 239(53.9,88.2) 240(53.9,93.1) 241(58.8,0) 242(58.8,4.9) 243(58.8,9.8) 244(58.8,14.7) 245(58.8,19.6) 246(58.8,24.5) 247(58.8,29.4) 248(58.8,34.3) 249(58.8,39.2) 250(58.8,44.1) 251(58.8,49) 252(58.8,53.9) 253(58.8,58.8) 254(58.8,63.7) 255(58.8,68.6) 256(58.8,73.5) 257(58.8,78.4) 258(58.8,83.3) 259(58.8,88.2) 260(58.8,93.1) 261(63.7,0) 262(63.7,4.9) 263(63.7,9.8) 264(63.7,14.7) 265(63.7,19.6) 266(63.7,24.5) 267(63.7,29.4) 268(63.7,34.3) 269(63.7,39.2) 270(63.7,44.1) 271(63.7,49) 272(63.7,53.9) 273(63.7,58.8) 274(63.7,63.7) 275(63.7,68.6) 276(63.7,73.5) 277(63.7,78.4) 278(63.7,83.3) 279(63.7,88.2) 280(63.7,93.1) 281(68.6,0) 282(68.6,4.9) 283(68.6,9.8) 284(68.6,14.7) 285(68.6,19.6) 286(68.6,24.5) 287(68.6,29.4) 288(68.6,34.3) 289(68.6,39.2) 290(68.6,44.1) 291(68.6,49) 292(68.6,53.9) 293(68.6,58.8) 294(68.6,63.7) 295(68.6,68.6) 296(68.6,73.5) 297(68.6,78.4) 298(68.6,83.3) 299(68.6,88.2) 300(68.6,93.1) 301(73.5,0) 302(73.5,4.9) 303(73.5,9.8) 304(73.5,14.7) 305(73.5,19.6) 306(73.5,24.5) 307(73.5,29.4) 308(73.5,34.3) 309(73.5,39.2) 310(73.5,44.1) 311(73.5,49) 312(73.5,53.9) 313(73.5,58.8) 314(73.5,63.7) 315(73.5,68.6) 316(73.5,73.5) 317(73.5,78.4) 318(73.5,83.3) 319(73.5,88.2) 320(73.5,93.1) 321(78.4,0) 322(78.4,4.9) 323(78.4,9.8) 324(78.4,14.7) 325(78.4,19.6) 326(78.4,24.5) 327(78.4,29.4) 328(78.4,34.3) 329(78.4,39.2) 330(78.4,44.1) 331(78.4,49) 332(78.4,53.9) 333(78.4,58.8) 334(78.4,63.7) 335(78.4,68.6) 336(78.4,73.5) 337(78.4,78.4) 338(78.4,83.3) 339(78.4,88.2) 340(78.4,93.1) 341(83.3,0) 342(83.3,4.9) 343(83.3,9.8) 344(83.3,14.7) 345(83.3,19.6) 346(83.3,24.5) 347(83.3,29.4) 348(83.3,34.3) 349(83.3,39.2) 350(83.3,44.1) 351(83.3,49) 352(83.3,53.9) 353(83.3,58.8) 354(83.3,63.7) 355(83.3,68.6) 356(83.3,73.5) 357(83.3,78.4) 358(83.3,83.3) 359(83.3,88.2) 360(83.3,93.1) 361(88.2,0) 362(88.2,4.9) 363(88.2,9.8) 364(88.2,14.7) 365(88.2,19.6) 366(88.2,24.5) 367(88.2,29.4) 368(88.2,34.3) 369(88.2,39.2) 370(88.2,44.1) 371(88.2,49) 372(88.2,53.9) 373(88.2,58.8) 374(88.2,63.7) 375(88.2,68.6) 376(88.2,73.5) 377(88.2,78.4) 378(88.2,83.3) 379(88.2,88.2) 380(88.2,93.1) 381(93.1,0) 382(93.1,4.9) 383(93.1,9.8) 384(93.1,14.7) 385(93.1,19.6) 386(93.1,24.5) 387(93.1,29.4) 388(93.1,34.3) 389(93.1,39.2) 390(93.1,44.1) 391(93.1,49) 392(93.1,53.9) 393(93.1,58.8) 394(93.1,63.7) 395(93.1,68.6) 396(93.1,73.5) 397(93.1,78.4) 398(93.1,83.3) 399(93.1,88.2) 400(93.1,93.1)
Top Silk:
  lines w0.1: -3.45,-0.45 -3.45,96.55 96.55,96.55 96.55,-3.45 -0.45,-3.45 -3.45,-0.45
Top Solder Resist:
  text ".Designator" at 0,-4.2 h0.35
Top Assembly:
  lines w0.05: -3.45,-0.45 -3.45,96.55 96.55,96.55 96.55,-3.45 -0.45,-3.45 -3.45,-0.45
Top Placement:
  lines w0.01: -1.11,-1.11 -1.11,94.21 94.21,94.21 94.21,-1.11 -1.11,-1.11